# Altium footprint library 3.03-USB3.1 Type C-M.2-NGFF-HDMI-PCI-E接口.PcbLib: 40 footprints (part 1 of 3)
Each footprint in its own frame and in the unit in brackets; x right, y up, seen from the top. Pads: shape width x height; smd on the part's side, far side on the other; paste and mask are expansions set on the pad; w line width, h text height; cw(c..) or ccw(c..) is an arc to the next point about the centre after c.
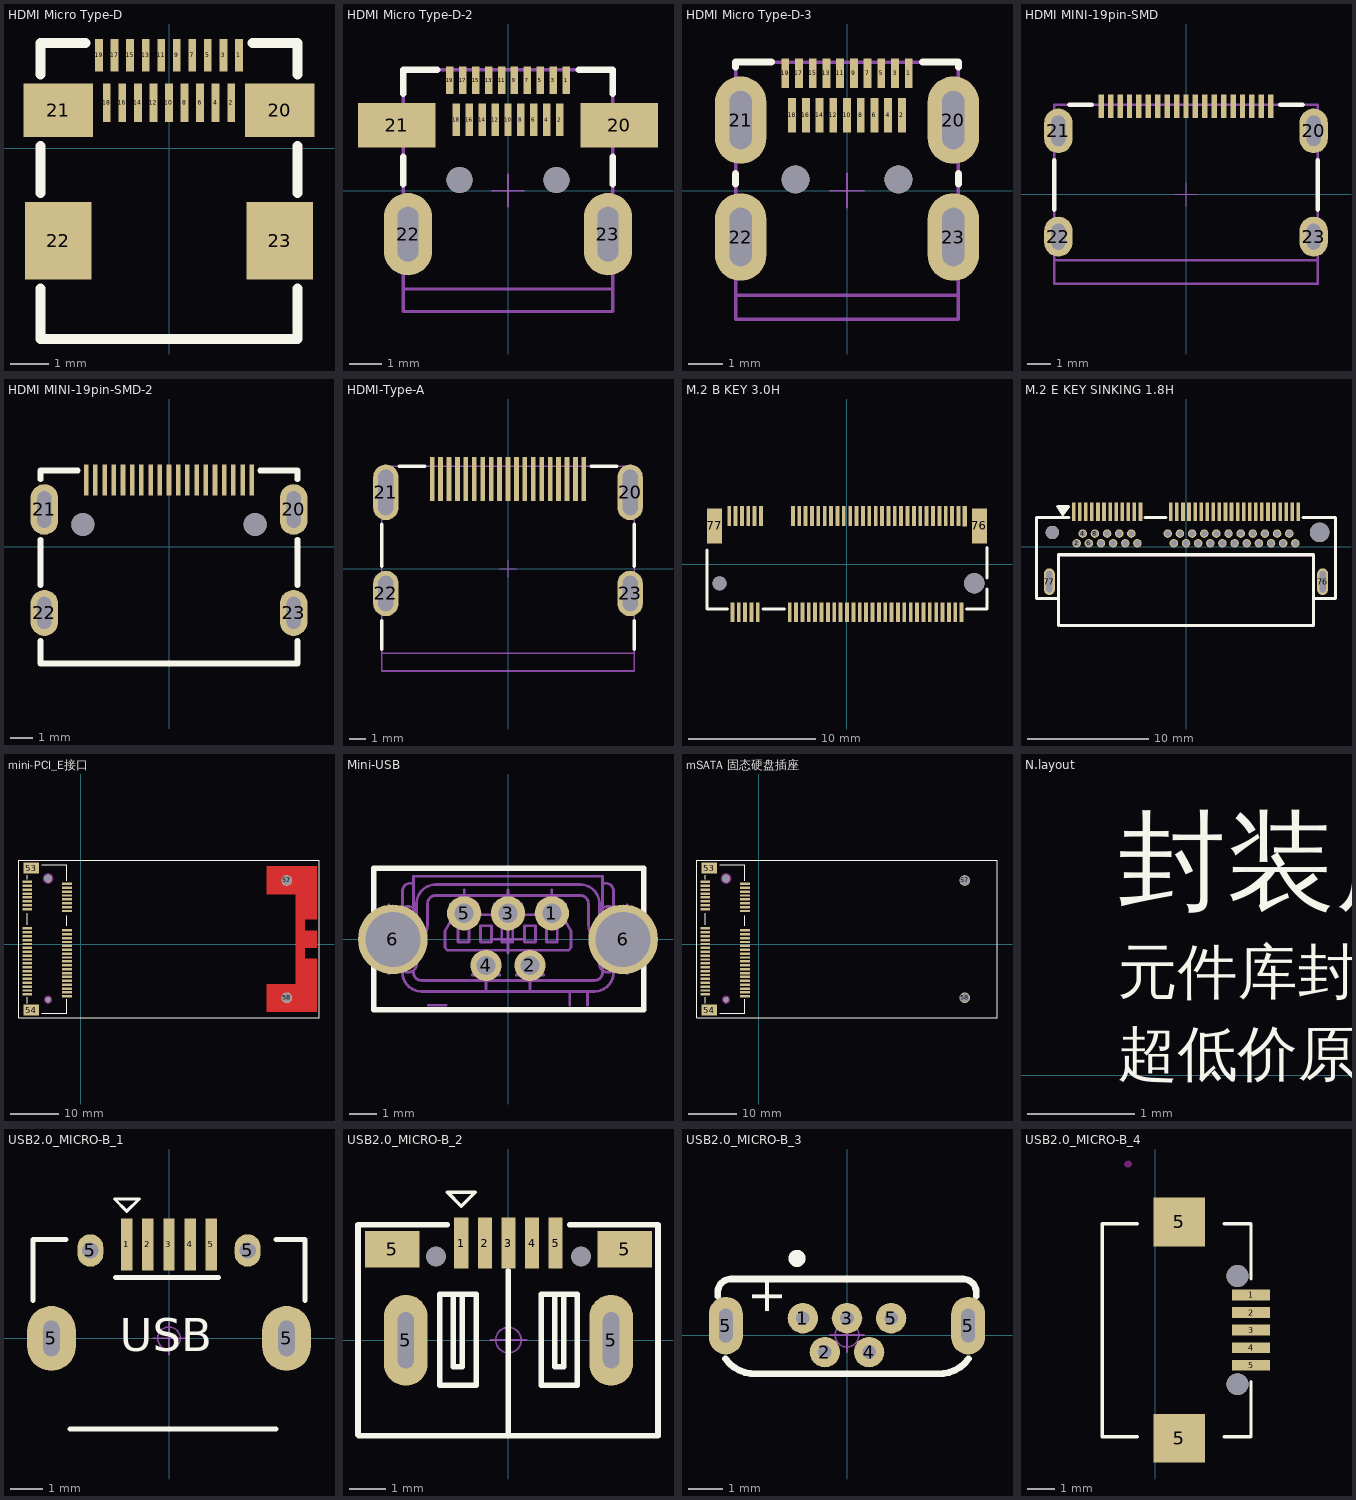
[diagram p0: the footprints below, top view; thin cyan lines are the x and y axes]

## HDMI Micro Type-D [mm] "0.4mm Pitch, Surface Mount Right Angle 19 Contacts Micro HDMI Type-D Receptacle With Kapton Tape  And SMT Mounting Pads"
pads (23):
  rect 0.2x0.84 smd: 1(1.8,2.385) 3(1.4,2.385) 5(1,2.385) 7(0.6,2.385) 9(0.2,2.385) 11(-0.2,2.385) 13(-0.6,2.385) 15(-1,2.385) 17(-1.4,2.385) 19(-1.8,2.385)
  rect 0.2x1 smd: 2(1.6,1.165) 4(1.2,1.165) 6(0.8,1.165) 8(0.4,1.165) 10(0,1.165) 12(-0.4,1.165) 14(-0.8,1.165) 16(-1.2,1.165) 18(-1.6,1.165)
  rect 1.8x1.38 smd: 20(2.85,0.975) 21(-2.85,0.975)
  rect 1.7x2 smd: 22(-2.85,-2.385) 23(2.85,-2.385)
Top Overlay:
  lines w0.254: -3.302,-3.616 -3.302,-4.914 3.302,-4.914 3.302,-3.616 ; -3.302,-1.154 -3.302,0.054 ; -3.302,1.896 -3.302,2.706 -2.146,2.706 ; 2.146,2.706 3.302,2.706 3.302,1.896 ; 3.302,-1.154 3.302,0.054
3D body "HDMI-D.STEP": height 2.9, standoff 0, extent -3.25,-4.784 3.25,2.715

## HDMI Micro Type-D-2 [mm] "Micro HDMI Horizontal SMT Hybrid Mount"
height 3
pads (25):
  rect 0.23x0.85 smd: 1(1.8,3.425) 3(1.4,3.425) 5(1,3.425) 7(0.6,3.425) 9(0.2,3.425) 11(-0.2,3.425) 13(-0.6,3.425) 15(-1,3.425) 17(-1.4,3.425) 19(-1.8,3.425)
  rect 0.23x1 smd: 2(1.6,2.2) 4(1.2,2.2) 6(0.8,2.2) 8(0.4,2.2) 10(0,2.2) 12(-0.4,2.2) 14(-0.8,2.2) 16(-1.2,2.2) 18(-1.6,2.2)
  rect 2.4x1.38 smd: 20(3.45,2.02) 21(-3.45,2.02)
  oval 1.5x2.55 hole 0.65 slot 1.7 at 90 deg: 22(-3.1,-1.35) 23(3.1,-1.35)
  round 0.81 hole 0.81 unplated: ""(-1.5,0.33) ""(1.5,0.33)
Top Overlay:
  lines w0.2: -3.25,0.2 -3.25,1.05 ; -3.25,3 -3.25,3.75 -2.2,3.75 ; 2.2,3.75 3.25,3.75 3.25,3 ; 3.25,0.2 3.25,1.05
Mechanical 2:
  lines w0.1: -3.25,-3.05 3.25,-3.05
  text "PCB Edge" at -1.311,-3.711 h0.41
Mechanical 13:
  lines w0.1: -3.25,-3.75 -3.25,3.75 3.25,3.75 3.25,-3.75 -3.25,-3.75
Mechanical 15:
  lines w0.05: -0.5,0 0.5,0 ; 0,-0.5 0,0.5
3D body "HDMI Micro2.stp": height 2.99, standoff -1.11, extent -4.509,-3.768 4.509,3.737

## HDMI Micro Type-D-3 [mm] "Micro HDMI Horizontal SMT"
height 3
pads (25):
  rect 0.23x0.85 smd: 1(1.8,3.425) 3(1.4,3.425) 5(1,3.425) 7(0.6,3.425) 9(0.2,3.425) 11(-0.2,3.425) 13(-0.6,3.425) 15(-1,3.425) 17(-1.4,3.425) 19(-1.8,3.425)
  rect 0.23x1 smd: 2(1.6,2.2) 4(1.2,2.2) 6(0.8,2.2) 8(0.4,2.2) 10(0,2.2) 12(-0.4,2.2) 14(-0.8,2.2) 16(-1.2,2.2) 18(-1.6,2.2)
  oval 1.5x2.55 hole 0.65 slot 1.7 at 90 deg: 20(3.1,2.06) 21(-3.1,2.06) 22(-3.1,-1.35) 23(3.1,-1.35)
  round 0.81 hole 0.81 unplated: ""(-1.5,0.33) ""(1.5,0.33)
Top Overlay:
  lines w0.2: -3.25,0.2 -3.25,0.5 ; -3.25,3.6 -3.25,3.75 -2.2,3.75 ; 2.2,3.75 3.25,3.75 3.25,3.6 ; 3.25,0.2 3.25,0.5
Mechanical 2:
  lines w0.1: -3.25,-3.05 3.25,-3.05
  text "PCB Edge" at -1.219,-3.683 h0.41
Mechanical 13:
  lines w0.1: -3.25,-3.75 -3.25,3.75 3.25,3.75 3.25,-3.75 -3.25,-3.75
Mechanical 15:
  lines w0.05: -0.5,0 0.5,0 ; 0,-0.5 0,0.5
3D body "HDMI Micro3.stp": height 2.99, standoff -1.11, extent -3.25,-3.895 3.25,3.61

## HDMI MINI-19pin-SMD [mm] "Mini HDMI SMT Horizontal"
height 3.3
pads (23):
  rect 0.23x1 smd: 1(3.6,3.75) 2(3.2,3.75) 3(2.8,3.75) 4(2.4,3.75) 5(2,3.75) 6(1.6,3.75) 7(1.2,3.75) 8(0.8,3.75) 9(0.4,3.75) 10(0,3.75) 11(-0.4,3.75) 12(-0.8,3.75) 13(-1.2,3.75) 14(-1.6,3.75) 15(-2,3.75) 16(-2.4,3.75) 17(-2.8,3.75) 18(-3.2,3.75) 19(-3.6,3.75)
  oval 1.2x1.9 hole 0.6 slot 1.3 at 90 deg: 20(5.425,2.7) 21(-5.425,2.7)
  oval 1.2x1.7 hole 0.6 slot 1.1 at 90 deg: 22(-5.425,-1.8) 23(5.425,-1.8)
Top Overlay:
  lines w0.2: -5.6,-0.65 -5.6,1.45 ; -4.95,3.8 -4,3.8 ; 4,3.8 4.95,3.8 ; 5.6,-0.65 5.6,1.45
Mechanical 2:
  lines w0.1: -5.6,-2.8 5.6,-2.8
  text "PCB Edge" at -1.831,-3.706 h0.61
Mechanical 13:
  lines w0.1: -5.6,-3.8 -5.6,3.8 5.6,3.8 5.6,-3.8 -5.6,-3.8
Mechanical 15:
  lines w0.05: -0.5,0 0.5,0 ; 0,-0.5 0,0.5
3D body "Mini HDMI-2.stp": height 3.3, standoff -2.15, extent -5.625,-3.833 5.625,4.069

## HDMI MINI-19pin-SMD-2 [mm] "HDMI-MINI-19pin JACK"
pads (25):
  rect 0.2x1.35 smd: 1(3.6,2.887) 2(3.2,2.887) 3(2.8,2.887) 4(2.4,2.887) 5(2,2.887) 6(1.6,2.887) 7(1.2,2.887) 8(0.8,2.887) 9(0.4,2.887) 10(0,2.887) 11(-0.4,2.887) 12(-0.8,2.887) 13(-1.2,2.887) 14(-1.6,2.887) 15(-2,2.887) 16(-2.4,2.887) 17(-2.8,2.887) 18(-3.2,2.887) 19(-3.6,2.887)
  oval 1.2x2.2 hole 0.61 slot 1.6 at 90 deg: 20(5.425,1.612) 21(-5.425,1.612)
  oval 1.2x2 hole 0.61 slot 1.4 at 90 deg: 22(-5.425,-2.888) 23(5.425,-2.888)
  round 1 hole 1 unplated: ""(-3.75,0.962) ""(3.75,0.962)
Top Overlay:
  lines w0.254: -5.588,-4.102 -5.588,-5.08 5.588,-5.08 5.588,-4.102 ; -5.588,-1.673 -5.588,0.298 ; -5.588,2.927 -5.588,3.302 -3.966,3.302 -4.191,3.302 ; 3.966,3.302 5.588,3.302 5.588,2.927 ; 5.588,-1.673 5.588,0.298
Top Paste:
  drawing of 23 lines, arcs and shapes, not listed
3D body "miniHDMI19PIN.stp": height 3.27, standoff -1.03, extent -5.6,-4.826 5.6,3.174

## HDMI-Type-A [mm] "HDMI SMT Horizontal"
height 6.13
pads (23):
  rect 0.28x2.6 smd: 1(4.5,5.325) 2(4,5.325) 3(3.5,5.325) 4(3,5.325) 5(2.5,5.325) 6(2,5.325) 7(1.5,5.325) 8(1,5.325) 9(0.5,5.325) 10(0,5.325) 11(-0.5,5.325) 12(-1,5.325) 13(-1.5,5.325) 14(-2,5.325) 15(-2.5,5.325) 16(-3,5.325) 17(-3.5,5.325) 18(-4,5.325) 19(-4.5,5.325)
  oval 1.5x3.3 hole 0.9 slot 2.7 at 90 deg: 20(7.25,4.525) 21(-7.25,4.525)
  oval 1.5x2.7 hole 0.9 slot 2.1 at 90 deg: 22(-7.25,-1.475) 23(7.25,-1.475)
Top Overlay:
  lines w0.2: -7.5,-4.775 -7.5,-3.075 ; -7.5,0.125 -7.5,2.625 ; -6.45,6.075 -4.95,6.075 ; 4.95,6.075 6.45,6.075 ; 7.5,-4.775 7.5,-3.075 ; 7.5,0.125 7.5,2.625
Mechanical 2:
  lines w0.1: -7.5,-5.025 7.5,-5.025
  text "PCB Edge" at -1.989,-5.88 h0.61
Mechanical 13:
  lines w0.1: 7.5,6.075 7.5,-6.075 -7.5,-6.075 -7.5,6.075 7.5,6.075
Mechanical 15:
  lines w0.05: -0.5,0 0.5,0 ; 0,-0.5 0,0.5
3D body "HDMI-Type-A.stp": height 6.17, standoff -2.2, extent -7.55,-6.206 7.45,5.944

## M.2 B KEY 3.0H [mm] "封装库来自淘宝ID:黄晶宝石"
pads (71):
  rect 0.3x1.55 smd: 1(-9.25,3.775) 2(-9,-3.775) 3(-8.75,3.775) 4(-8.5,-3.775) 5(-8.25,3.775) 6(-8,-3.775) 7(-7.75,3.775) 8(-7.5,-3.775) 9(-7.25,3.775) 10(-7,-3.775) 11(-6.75,3.775) 20(-4.5,-3.775) 21(-4.25,3.775) 22(-4,-3.775) 23(-3.75,3.775) 24(-3.5,-3.775) 25(-3.25,3.775) 26(-3,-3.775) 27(-2.75,3.775) 28(-2.5,-3.775) 29(-2.25,3.775) 30(-2,-3.775) 31(-1.75,3.775) 32(-1.5,-3.775) 33(-1.25,3.775) 34(-1,-3.775) 35(-0.75,3.775) 36(-0.5,-3.775) 37(-0.25,3.775) 38(0,-3.775) 39(0.25,3.775) 40(0.5,-3.775) 41(0.75,3.775) 42(1,-3.775) 43(1.25,3.775) 44(1.5,-3.775) 45(1.75,3.775) 46(2,-3.775) 47(2.25,3.775) 48(2.5,-3.775) 49(2.75,3.775) 50(3,-3.775) 51(3.25,3.775) 52(3.5,-3.775) 53(3.75,3.775) 54(4,-3.775) 55(4.25,3.775) 56(4.5,-3.775) 57(4.75,3.775) 58(5,-3.775) 59(5.25,3.775) 60(5.5,-3.775) 61(5.75,3.775) 62(6,-3.775) 63(6.25,3.775) 64(6.5,-3.775) 65(6.75,3.775) 66(7,-3.775) 67(7.25,3.775) 68(7.5,-3.775) 69(7.75,3.775) 70(8,-3.775) 71(8.25,3.775) 72(8.5,-3.775) 73(8.75,3.775) 74(9,-3.775)
  rect 0.33x1.6 smd: 75(9.25,3.775)
  rect 1.2x2.75 smd: 76(10.4,3) 77(-10.4,3)
  round 1.1 hole 1.1 unplated: ""(-10,-1.5)
  round 1.6 hole 1.6 unplated: ""(10,-1.5)
Top Overlay:
  lines w0.254: -11,1.11 -11,-3.53 -9.396,-3.53 ; -6.604,-3.53 -4.896,-3.53 ; 9.396,-3.53 11,-3.53 11,-2.44 11,-1.968 ; 11,-1.093 11,1.29
Mechanical 15:
  circle w0.6: c10,-1.5 r0.3
  circle w0.4: c-10,-1.5 r0.2
3D body "M.2 B KEY 3.0H-2.stp": height 3.1, standoff -0.6, extent -10.9,-4.1 10.9,4.1

## M.2 E KEY SINKING 1.8H [mm] "封装库来自淘宝ID:黄晶宝石"
pads (71):
  rect 0.3x1.5 smd: 1(-9.25,2.875) 3(-8.75,2.875) 5(-8.25,2.875) 7(-7.75,2.875) 9(-7.25,2.875) 11(-6.75,2.875) 13(-6.25,2.875) 15(-5.75,2.875) 17(-5.25,2.875) 19(-4.75,2.875) 21(-4.25,2.875) 23(-3.75,2.875) 33(-1.25,2.875) 35(-0.75,2.875) 37(-0.25,2.875) 39(0.25,2.875) 41(0.75,2.875) 43(1.25,2.875) 45(1.75,2.875) 47(2.25,2.875) 49(2.75,2.875) 51(3.25,2.875) 53(3.75,2.875) 55(4.25,2.875) 57(4.75,2.875) 59(5.25,2.875) 61(5.75,2.875) 63(6.25,2.875) 65(6.75,2.875) 67(7.25,2.875) 69(7.75,2.875) 71(8.25,2.875) 73(8.75,2.875) 75(9.25,2.875)
  round 0.7 hole 0.5: 2(-9,0.284) 4(-8.5,1.085) 6(-8,0.284) 8(-7.5,1.085) 10(-7,0.284) 12(-6.5,1.085) 14(-6,0.285) 16(-5.5,1.085) 18(-5,0.285) 20(-4.5,1.085) 22(-4,0.284) 32(-1.5,1.085) 34(-1,0.284) 36(-0.5,1.085) 38(0,0.284) 40(0.5,1.085) 42(1,0.284) 44(1.5,1.085) 46(2,0.284) 48(2.5,1.085) 50(3,0.284) 52(3.5,1.085) 54(4,0.284) 56(4.5,1.085) 58(5,0.284) 60(5.5,1.084) 62(6,0.285) 64(6.5,1.084) 66(7,0.285) 68(7.5,1.085) 70(8,0.284) 72(8.5,1.085) 74(9,0.284)
  oval 0.9x2.2 hole 0.5 slot 1.75 at 90 deg: 76(11.25,-2.875) 77(-11.25,-2.875)
  round 1.1 hole 1.1 unplated: ""(-11,1.175)
  round 1.6 hole 1.6 unplated: ""(11,1.175)
Top Overlay:
  region: -10.556,3.323 -9.675,3.323 -10.15,2.662
  lines w0.254: -10.561,3.323 -10.15,2.662 -9.675,3.323 -10.556,3.323 ; -10.5,-6.472 -10.5,-0.672 ; -10.5,-4.277 -12.325,-4.277 -12.325,2.223 -12.325,2.398 -9.631,2.398 ; -10.5,-0.665 10.5,-0.665 ; -10.37,-6.472 10.5,-6.472 10.5,-0.672 ; -3.369,2.398 -1.631,2.398 ; 9.631,2.398 12.325,2.398 12.325,-4.277 10.5,-4.277
Top Paste:
  drawing of 69 lines, arcs and shapes, not listed
Keep-Out Layer:
  lines w0.254: -10.5,-6.472 -10.5,-0.672 ; -10.5,-0.665 10.5,-0.665 ; 10.5,-6.472 10.5,-0.672
Mechanical 15:
  circle w0.73: c11,1.175 r0.365
  circle w0.45: c-11,1.175 r0.225
  region: -10.556,3.323 -9.675,3.323 -10.15,2.662
3D body "M.2 E KEY SINKING 1.8H-2.stp": height 1.88, standoff -1.62, extent -12.325,-6.535 12.325,3.135

## mini-PCI_E接口 [mm] "封装库来自淘宝卖家 ID：黄晶宝石"
pads (58):
  rect 2x0.5 smd: 1(-11.049,12.827) 2(-2.849,12.427) 3(-11.049,12.027) 4(-2.849,11.627) 5(-11.049,11.227) 6(-2.849,10.827) 7(-11.049,10.427) 8(-2.849,10.027) 9(-11.049,9.627) 10(-2.849,9.227) 11(-11.049,8.827) 12(-2.849,8.427) 13(-11.049,8.027) 14(-2.849,7.627) 15(-11.049,7.227) 16(-2.849,6.827) 17(-11.049,3.227) 18(-2.849,2.827) 19(-11.049,2.427) 20(-2.849,2.027) 21(-11.049,1.627) 22(-2.849,1.227) 23(-11.049,0.827) 24(-2.849,0.427) 25(-11.049,0.027) 26(-2.849,-0.373) 27(-11.049,-0.773) 28(-2.849,-1.173) 29(-11.049,-1.573) 30(-2.849,-1.973) 31(-11.049,-2.373) 32(-2.849,-2.773) 33(-11.049,-3.173) 34(-2.849,-3.573) 35(-11.049,-3.973) 36(-2.849,-4.373) 37(-11.049,-4.773) 38(-2.849,-5.173) 39(-11.049,-5.573) 40(-2.849,-5.973) 41(-11.049,-6.373) 42(-2.849,-6.773) 43(-11.049,-7.173) 44(-2.849,-7.573) 45(-11.049,-7.973) 46(-2.849,-8.373) 47(-11.049,-8.773) 48(-2.849,-9.173) 49(-11.049,-9.573) 50(-2.849,-9.973) 51(-11.049,-10.373) 52(-2.849,-10.773)
  rect 3.2x2.3 smd: 53(-10.249,15.677) 54(-10.249,-13.623)
  round 1.6 hole 1.6 unplated: 55(-6.749,13.527)
  round 1.1 hole 1.1 unplated: 56(-6.749,-11.473)
  round 2.2 hole 2: 57(42.501,13.127)
  round 2.2 / inner round 2.2 / far side round 2 hole 2: 58(42.501,-11.073)
Top Layer:
  region: 38.405,16.027 38.405,10.312 44.348,10.312 44.348,-8.255 38.405,-8.255 38.405,-13.995 48.692,-13.995 48.692,-2.997 46.203,-2.997 46.203,-0.737 48.692,-0.737 48.692,2.794 46.203,2.794 46.203,5.08 48.692,5.08 48.692,16.027
Top Overlay:
  lines w0.127: -11.049,-12.173 -11.049,-10.973 ; -11.049,4.027 -11.049,6.327 ; -11.049,13.352 -11.049,14.192 ; -8.049,-14.273 -2.849,-14.273 -2.849,-11.373 ; -8.049,16.327 -2.849,16.327 -2.849,13.037 ; -2.849,3.748 -2.849,5.9 ; -12.749,-15.173 -12.749,17.327 49.151,17.327 49.151,-15.173 -12.749,-15.173
Keep-Out Layer:
  drawing of 2 lines, arcs and shapes, not listed

## Mini-USB [mm] "Straight, USB Serie Mini-B Type 2 Through Hole Receptacle"
height 7.7
pads (7):
  round 1.25 hole 0.7: 1(1.6,0.95) 3(0,0.95) 5(-1.6,0.95)
  round 1.143 hole 0.7: 2(0.8,-0.95) 4(-0.8,-0.95)
  round 2.54 hole 2.007: 6(-4.2,0) 6(4.2,0)
Top Overlay:
  lines w0.2: 1.4,0.5 1.8,0.5 ; -4.902,-2.565 -4.902,2.591 -3.031,2.591 4.953,2.591 4.953,-2.565 -4.902,-2.565
Mechanical 8:
  lines w0.1: -4.35,-1.25 -4.35,1.25 ; -4.15,0 -3.65,0 ; -3.65,-0.5 -3.65,0 ; -3.65,0.5 -3.65,0 ; -3.15,0 -3.65,0 ; -2.1,1.3 -1.6,1.3 ; -1.6,0.8 -1.6,1.3 ; -1.6,1.8 -1.6,1.3 ; -1.3,-1.3 -0.8,-1.3 ; -1.1,1.3 -1.6,1.3 ; -0.8,-1.8 -0.8,-1.3 ; -0.8,-0.8 -0.8,-1.3 ; -0.5,0 0,0 ; -0.5,1.3 0,1.3 ; -0.3,-1.3 -0.8,-1.3 ; 0,-0.5 0,0 ; 0,0.5 0,0 ; 0,0.8 0,1.3 ; 0,1.8 0,1.3 ; 0.3,-1.3 0.8,-1.3 ; 0.5,0 0,0 ; 0.5,1.3 0,1.3 ; 0.8,-1.8 0.8,-1.3 ; 0.8,-0.8 0.8,-1.3 ; 1.1,1.3 1.6,1.3 ; 1.3,-1.3 0.8,-1.3 ; 1.6,0.8 1.6,1.3 ; 1.6,1.8 1.6,1.3 ; 2.1,1.3 1.6,1.3 ; 3.15,0 3.65,0 ; 3.65,-0.5 3.65,0 ; 3.65,0.5 3.65,0 ; 4.15,0 3.65,0 ; 4.35,-1.25 4.35,1.25 ; -3.975,-0.875 ccw(c-3.65,-0.875) -3.325,-0.875 -3.325,0.875 ccw(c-3.65,0.875) -3.975,0.875 -3.975,-0.875 ; 3.325,-0.875 ccw(c3.65,-0.875) 3.975,-0.875 3.975,0.875 ccw(c3.65,0.875) 3.325,0.875 3.325,-0.875
Mechanical 14:
  lines w0.1: -3.45,-1.2 ccw(c-3.15,-1.2) -3.15,-1.5 3.15,-1.5 ccw(c3.15,-1.2) 3.45,-1.2 3.45,-0.403 ccw(c3.15,-0.403) 3.363,-0.192 3.138,0.035 cw(c3.635,0.528) 2.935,0.528 2.935,1.3 ccw(c2.635,1.3) 2.635,1.6 -2.635,1.6 ccw(c-2.635,1.3) -2.935,1.3 -2.935,0.528 cw(c-3.635,0.528) -3.138,0.035 -3.363,-0.192 ccw(c-3.15,-0.403) -3.45,-0.403 ; -3.45,0.288 -3.45,2.3 3.45,2.3 3.45,0.288 ; -3.45,2.05 -3.55,2.05 ccw(c-3.55,1.75) -3.85,1.75 -3.85,-0.403 ; -2.9,-2.4 -2.25,-2.4 ; 2.25,-2.4 2.25,-1.9 ; 2.9,-2.4 2.9,-1.9 ; 3.45,2.05 3.55,2.05 cw(c3.55,1.75) 3.85,1.75 3.85,-0.403 ; -3.85,-0.403 cw(c-3.15,-0.403) -3.647,0.089 -3.422,0.317 ccw(c-3.635,0.528) -3.335,0.528 -3.335,1.3 cw(c-2.635,1.3) -2.635,2 2.635,2 cw(c2.635,1.3) 3.335,1.3 3.335,0.528 ccw(c3.635,0.528) 3.422,0.317 3.647,0.089 cw(c3.15,-0.403) 3.85,-0.403 ; -3.85,-0.403 -3.85,-1.2 ccw(c-3.15,-1.2) -3.15,-1.9 3.15,-1.9 ccw(c3.15,-1.2) 3.85,-1.2 3.85,-0.403 ; 2.2,-0.4 2.3,-0.3 ; 2.2,-0.4 -2.2,-0.4 -2.3,-0.3 -2.3,0.3 -1.838,1.1 -1.318,1.1 -1.118,0.9 1.118,0.9 1.318,1.1 1.838,1.1 2.3,0.3 2.3,-0.3 ; 2.2,-0.4 2.3,-0.3 ; -1.825,-0.1 -1.425,-0.1 -1.425,0.5 -1.825,0.5 -1.825,-0.1 ; -1,-0.1 -0.6,-0.1 -0.6,0.5 -1,0.5 -1,-0.1 ; -0.225,-0.1 0.175,-0.1 0.175,0.5 -0.225,0.5 -0.225,-0.1 ; 0.6,-0.1 1,-0.1 1,0.5 0.6,0.5 0.6,-0.1 ; 1.4,-0.1 1.8,-0.1 1.8,0.5 1.4,0.5 1.4,-0.1
3D body "MOLEX_500075-1517.stp": height 7.7, standoff -2.1, extent -3.85,-2.4 3.85,2.3

## mSATA 固态硬盘插座 [mm] "封装库来自淘宝卖家 ID：黄晶宝石"
pads (58):
  rect 2x0.5 smd: 1(-11.049,12.827) 2(-2.849,12.427) 3(-11.049,12.027) 4(-2.849,11.627) 5(-11.049,11.227) 6(-2.849,10.827) 7(-11.049,10.427) 8(-2.849,10.027) 9(-11.049,9.627) 10(-2.849,9.227) 11(-11.049,8.827) 12(-2.849,8.427) 13(-11.049,8.027) 14(-2.849,7.627) 15(-11.049,7.227) 16(-2.849,6.827) 17(-11.049,3.227) 18(-2.849,2.827) 19(-11.049,2.427) 20(-2.849,2.027) 21(-11.049,1.627) 22(-2.849,1.227) 23(-11.049,0.827) 24(-2.849,0.427) 25(-11.049,0.027) 26(-2.849,-0.373) 27(-11.049,-0.773) 28(-2.849,-1.173) 29(-11.049,-1.573) 30(-2.849,-1.973) 31(-11.049,-2.373) 32(-2.849,-2.773) 33(-11.049,-3.173) 34(-2.849,-3.573) 35(-11.049,-3.973) 36(-2.849,-4.373) 37(-11.049,-4.773) 38(-2.849,-5.173) 39(-11.049,-5.573) 40(-2.849,-5.973) 41(-11.049,-6.373) 42(-2.849,-6.773) 43(-11.049,-7.173) 44(-2.849,-7.573) 45(-11.049,-7.973) 46(-2.849,-8.373) 47(-11.049,-8.773) 48(-2.849,-9.173) 49(-11.049,-9.573) 50(-2.849,-9.973) 51(-11.049,-10.373) 52(-2.849,-10.773)
  rect 3.2x2.3 smd: 53(-10.249,15.677) 54(-10.249,-13.623)
  round 1.6 hole 1.6 unplated: 55(-6.749,13.527)
  round 1.1 hole 1.1 unplated: 56(-6.749,-11.473)
  round 2.2 hole 2: 57(42.501,13.127)
  round 2.2 / inner round 2.2 / far side round 2 hole 2: 58(42.501,-11.073)
Top Overlay:
  lines w0.127: -11.049,-12.173 -11.049,-10.973 ; -11.049,4.027 -11.049,6.327 ; -11.049,13.352 -11.049,14.192 ; -8.049,-14.273 -2.849,-14.273 -2.849,-11.373 ; -8.049,16.327 -2.849,16.327 -2.849,13.037 ; -2.849,3.748 -2.849,5.9 ; -12.749,-15.173 49.151,-15.173 49.151,17.327 -12.749,17.327 -12.749,-15.173
Keep-Out Layer:
  drawing of 2 lines, arcs and shapes, not listed

## N.layout [mm]
Top Overlay:
  text "元件库封装库制作https://shop463601444.taobao.com" at -5.715,0.635 h0.7
  text "超低价原理图设计、PCB代画，布局合理，走线规范" at -5.715,-0.127 h0.7
  text "封装库来自淘宝ID:黄晶宝石" at -5.715,1.397 h1.27

## USB2.0_MICRO-B_1 [mm] "micro型USB ，5.7*7.8*2.5mm  封装库来自淘宝ID:黄晶宝石"
pads (9):
  rect 0.35x1.6 smd: 1(-1.3,2.9) 2(-0.65,2.9) 3(0,2.9) 4(0.65,2.9) 5(1.3,2.9)
  oval 1.5x2 hole 0.5 slot 1.1 at 90 deg: 5(-3.625,0) 5(3.625,0)
  oval 0.8x1 hole 0.5: 5(-2.425,2.71) 5(2.425,2.71)
Top Overlay:
  lines w0.1: -1.681,4.297 -0.919,4.297 -1.3,3.916 -1.681,4.297
  lines w0.152: -4.191,1.168 -4.191,3.048 -3.175,3.048 ; -3.048,-2.794 3.302,-2.794 ; -1.65,1.875 1.525,1.875 ; 3.302,3.048 4.191,3.048 4.191,1.168
  text "USB" at -1.524,-0.402 h1.02
Mechanical 15:
  circle w0.05: c0,0 r0.35
  lines w0.05: -0.5,0 0.5,0 ; 0,-0.5 0,0.5
3D body "USB_MICRO_a.STEP": height 2.8, standoff -0.95, extent -4.001,-2.71 4.001,2.89

## USB2.0_MICRO-B_2 [mm] "micro型USB ，5.9*8.2*2.5mm 封装库来自淘宝ID:黄晶宝石"
pads (11):
  round 0 hole 0.55 unplated: 0(-2,2.294) 0(2,2.294)
  rect 0.394x1.4 smd: 1(-1.295,2.667) 2(-0.648,2.667) 3(0,2.667) 4(0.648,2.667) 5(1.295,2.667)
  rect 1.5x1 smd: 5(-3.2,2.5) 5(3.2,2.5)
  oval 1.2x2.5 hole 0.45 slot 1.55 at 90 deg: 5(-2.825,-0.006) 5(2.825,-0.006)
Top Overlay:
  lines w0.1: -1.676,4.064 -1.295,3.683 -0.914,4.064 -1.676,4.064
  lines w0.15: -4.14,3.175 -1.689,3.175 ; 0,-2.629 0,1.905 ; 1.689,3.175 4.115,3.175
  lines w0.152: -4.14,-2.603 -4.14,3.175 ; -4.115,-2.629 4.089,-2.629 ; -1.524,1.257 -1.524,-0.728 -1.321,-0.728 -1.27,-0.728 -1.27,1.257 ; 1.27,1.257 1.27,-0.728 1.524,-0.728 1.524,1.257 ; 4.115,-2.629 4.115,3.175 ; -1.885,-1.243 -0.885,-1.243 -0.885,1.257 -1.885,1.257 -1.885,-1.243 ; 0.896,-1.243 0.896,1.257 1.896,1.257 1.896,-1.243 0.896,-1.243
Mechanical 15:
  circle w0.05: c0,0 r0.35
  lines w0.05: -0.5,0 0.5,0 ; 0,-0.5 0,0.5
3D body "USB_MICRO_b.STEP": height 2.8, standoff -1.35, extent -4.001,-2.71 4.001,2.89

## USB2.0_MICRO-B_3 [mm] "micro型USB ，5.7*7.8*2.5mm封装库来自淘宝ID:黄晶宝石"
pads (7):
  round 0.9 hole 0.4: 1(-1.3,0.5) 2(-0.65,-0.5) 3(0,0.5) 4(0.65,-0.5) 5(1.3,0.5)
  oval 1x1.7 hole 0.4 slot 1 at 90 deg: 5(-3.575,0.28) 5(3.575,0.28)
Top Overlay:
  circle w0.254: c-1.473,2.261 r0.127
  lines w0.2: -3.81,1.143 -3.81,1.27 cw(c-3.429,1.27) -3.429,1.651 -3.175,1.651 -2.794,1.651 2.794,1.651 3.175,1.651 3.429,1.651 cw(c3.429,1.27) 3.81,1.27 3.81,1.143 ; -3.587,-0.697 ccw(c-2.718,-0.076) -2.667,-1.143 ; -2.629,-1.143 -2.413,-1.143 2.413,-1.143 2.667,-1.143 ccw(c2.718,-0.076) 3.587,-0.697
  text "+" at -1.905,0.559 h1.02
Mechanical 15:
  circle w0.05: c0,0 r0.35
  lines w0.05: -0.5,0 0.5,0 ; 0,-0.5 0,0.5
3D body "USB_MICRO_c.STEP": height 5.65, standoff -1.55, extent -4.001,-1.207 4.001,1.767

## USB2.0_MICRO-B_4 [mm] "micro型USB ，5.7*7.5*2.5mm封装库来自淘宝ID:黄晶宝石"
pads (7):
  rect 1.4x0.4 smd: 1(3.544,13.803) 2(3.544,13.153) 3(3.544,12.503) 4(3.544,11.853) 5(3.544,11.203)
  rect 1.9x1.8 smd: 5(0.894,8.503) 5(0.894,16.503)
via 3.044,10.503 diameter 0.8 hole 0.8
via 3.044,14.503 diameter 0.8 hole 0.8
Top Overlay:
  lines w0.127: -1.964,8.566 -0.656,8.566 ; -1.964,8.603 -1.964,16.403 ; -1.964,16.44 -0.656,16.44 ; 2.544,8.566 3.544,8.566 3.544,10.598 ; 2.544,16.44 3.544,16.44 ; 3.544,14.408 3.544,16.403
Keep-Out Layer:
  lines w0.254: -1.016,18.633 -0.991,18.644
3D body "User Library-Micro USB.STEP": height 2.72, standoff -0.22, extent -1.861,8.513 3.569,16.493